# Altium footprint library con-molex.PCBLIB: 369 footprints (part 21 of 26)
Each footprint in its own frame and in the unit in brackets; x right, y up, seen from the top. Pads: shape width x height; smd on the part's side, far side on the other; paste and mask are expansions set on the pad; w line width, h text height; cw(c..) or ccw(c..) is an arc to the next point about the centre after c.
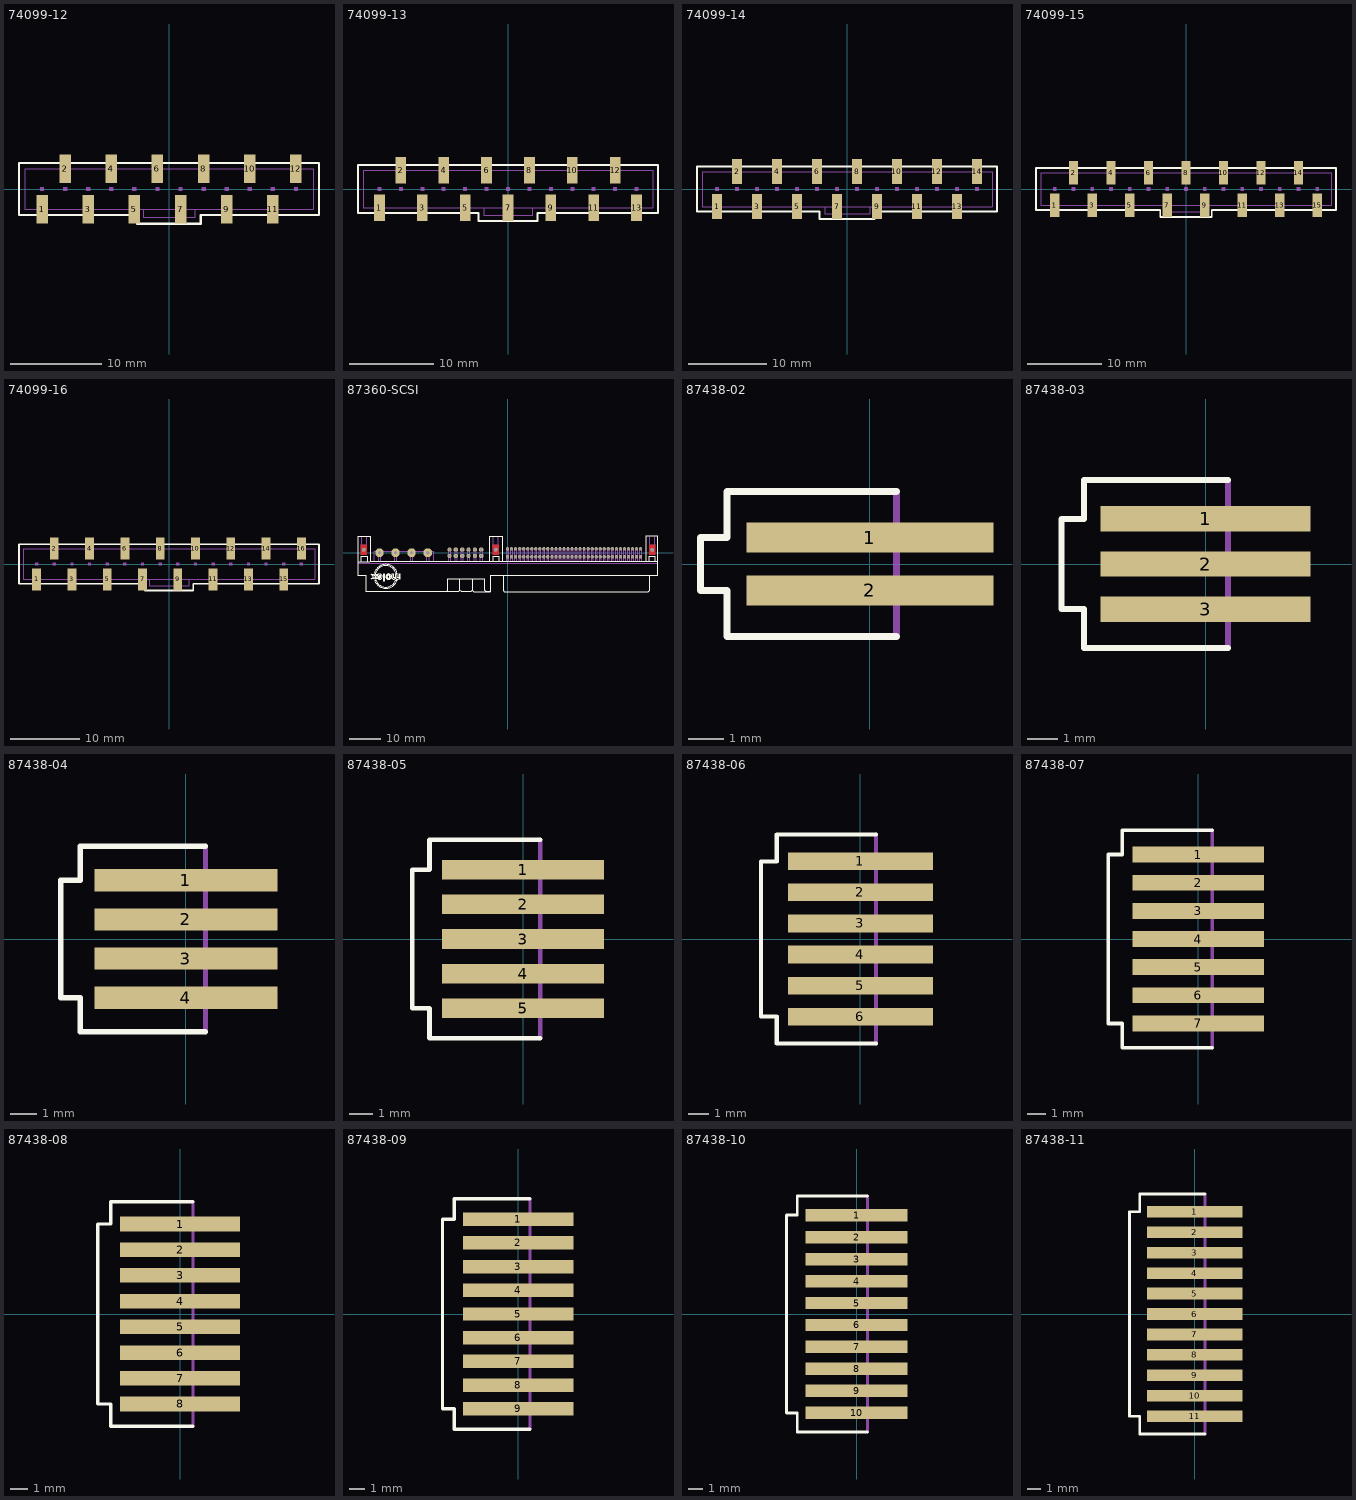
[diagram p20: the footprints below, top view; thin cyan lines are the x and y axes]

## 74099-12 [mil]
pads (12):
  rect 50x125 smd: 1(-550,-87.5) 2(-450,87.5) 3(-350,-87.5) 4(-250,87.5) 5(-150,-87.5) 6(-50,87.5) 7(50,-87.5) 8(150,87.5) 9(250,-87.5) 10(350,87.5) 11(450,-87.5) 12(550,87.5)
Top Overlay:
  lines w10: -650,-112.5 -650,112.5 650,112.5 650,-112.5 137.5,-112.5 137.5,-150 -137.5,-150 -137.5,-112.5 -650,-112.5
Mechanical 16:
  rectangle: -359.37,-9.37 -340.63,9.37
  rectangle: -459.37,-9.37 -440.63,9.37
  rectangle: -159.37,-9.37 -140.63,9.37
  rectangle: -259.37,-9.37 -240.63,9.37
  rectangle: -559.37,-9.37 -540.63,9.37
  rectangle: -59.37,-9.37 -40.63,9.37
  rectangle: 40.63,-9.37 59.37,9.37
  rectangle: 140.63,-9.37 159.37,9.37
  rectangle: 240.63,-9.37 259.37,9.37
  rectangle: 340.63,-9.37 359.37,9.37
  rectangle: 440.63,-9.37 459.37,9.37
  rectangle: 540.63,-9.37 559.37,9.37
  lines w2: -112.5,-87.5 -625,-87.5 -625,87.5 625,87.5 625,-87.5 112.5,-87.5 ; -112.5,-87.5 112.5,-87.5 ; -112.5,-87.5 -112.5,-125 112.5,-125 112.5,-87.5
  text "1" at -612.5,-75 h62

## 74099-13 [mil]
pads (13):
  rect 50x125 smd: 1(-600,-87.5) 2(-500,87.5) 3(-400,-87.5) 4(-300,87.5) 5(-200,-87.5) 6(-100,87.5) 7(0,-87.5) 8(100,87.5) 9(200,-87.5) 10(300,87.5) 11(400,-87.5) 12(500,87.5) 13(600,-87.5)
Top Overlay:
  lines w10: -700,-112.5 -700,112.5 700,112.5 700,-112.5 137.5,-112.5 137.5,-150 -137.5,-150 -137.5,-112.5 -700,-112.5
Mechanical 16:
  rectangle: -409.37,-9.37 -390.63,9.37
  rectangle: -509.37,-9.37 -490.63,9.37
  rectangle: -209.37,-9.37 -190.63,9.37
  rectangle: -309.37,-9.37 -290.63,9.37
  rectangle: -609.37,-9.37 -590.63,9.37
  rectangle: -109.37,-9.37 -90.63,9.37
  rectangle: -9.37,-9.37 9.37,9.37
  rectangle: 90.63,-9.37 109.37,9.37
  rectangle: 190.63,-9.37 209.37,9.37
  rectangle: 290.63,-9.37 309.37,9.37
  rectangle: 390.63,-9.37 409.37,9.37
  rectangle: 490.63,-9.37 509.37,9.37
  rectangle: 590.63,-9.37 609.37,9.37
  lines w2: -112.5,-87.5 -675,-87.5 -675,87.5 675,87.5 675,-87.5 112.5,-87.5 ; -112.5,-87.5 112.5,-87.5 ; -112.5,-87.5 -112.5,-125 112.5,-125 112.5,-87.5
  text "1" at -662.5,-75 h62

## 74099-14 [mil]
pads (14):
  rect 50x125 smd: 1(-650,-87.5) 2(-550,87.5) 3(-450,-87.5) 4(-350,87.5) 5(-250,-87.5) 6(-150,87.5) 7(-50,-87.5) 8(50,87.5) 9(150,-87.5) 10(250,87.5) 11(350,-87.5) 12(450,87.5) 13(550,-87.5) 14(650,87.5)
Top Overlay:
  lines w10: -750,-112.5 -750,112.5 750,112.5 750,-112.5 137.5,-112.5 137.5,-150 -137.5,-150 -137.5,-112.5 -750,-112.5
Mechanical 16:
  rectangle: -459.37,-9.37 -440.63,9.37
  rectangle: -559.37,-9.37 -540.63,9.37
  rectangle: -259.37,-9.37 -240.63,9.37
  rectangle: -359.37,-9.37 -340.63,9.37
  rectangle: -659.37,-9.37 -640.63,9.37
  rectangle: -159.37,-9.37 -140.63,9.37
  rectangle: -59.37,-9.37 -40.63,9.37
  rectangle: 40.63,-9.37 59.37,9.37
  rectangle: 140.63,-9.37 159.37,9.37
  rectangle: 240.63,-9.37 259.37,9.37
  rectangle: 340.63,-9.37 359.37,9.37
  rectangle: 440.63,-9.37 459.37,9.37
  rectangle: 540.63,-9.37 559.37,9.37
  rectangle: 640.63,-9.37 659.37,9.37
  lines w2: -112.5,-87.5 -725,-87.5 -725,87.5 725,87.5 725,-87.5 112.5,-87.5 ; -112.5,-87.5 112.5,-87.5 ; -112.5,-87.5 -112.5,-125 112.5,-125 112.5,-87.5
  text "1" at -712.5,-75 h62

## 74099-15 [mil]
pads (15):
  rect 50x125 smd: 1(-700,-87.5) 2(-600,87.5) 3(-500,-87.5) 4(-400,87.5) 5(-300,-87.5) 6(-200,87.5) 7(-100,-87.5) 8(0,87.5) 9(100,-87.5) 10(200,87.5) 11(300,-87.5) 12(400,87.5) 13(500,-87.5) 14(600,87.5) 15(700,-87.5)
Top Overlay:
  lines w10: -800,-112.5 -800,112.5 800,112.5 800,-112.5 137.5,-112.5 137.5,-150 -137.5,-150 -137.5,-112.5 -800,-112.5
Mechanical 16:
  rectangle: -509.37,-9.37 -490.63,9.37
  rectangle: -609.37,-9.37 -590.63,9.37
  rectangle: -309.37,-9.37 -290.63,9.37
  rectangle: -409.37,-9.37 -390.63,9.37
  rectangle: -709.37,-9.37 -690.63,9.37
  rectangle: -209.37,-9.37 -190.63,9.37
  rectangle: -109.37,-9.37 -90.63,9.37
  rectangle: -9.37,-9.37 9.37,9.37
  rectangle: 90.63,-9.37 109.37,9.37
  rectangle: 190.63,-9.37 209.37,9.37
  rectangle: 290.63,-9.37 309.37,9.37
  rectangle: 390.63,-9.37 409.37,9.37
  rectangle: 490.63,-9.37 509.37,9.37
  rectangle: 590.63,-9.37 609.37,9.37
  rectangle: 690.63,-9.37 709.37,9.37
  lines w2: -112.5,-87.5 -775,-87.5 -775,87.5 775,87.5 775,-87.5 112.5,-87.5 ; -112.5,-87.5 112.5,-87.5 ; -112.5,-87.5 -112.5,-125 112.5,-125 112.5,-87.5
  text "1" at -762.5,-75 h62

## 74099-16 [mil]
pads (16):
  rect 50x125 smd: 1(-750,-87.5) 2(-650,87.5) 3(-550,-87.5) 4(-450,87.5) 5(-350,-87.5) 6(-250,87.5) 7(-150,-87.5) 8(-50,87.5) 9(50,-87.5) 10(150,87.5) 11(250,-87.5) 12(350,87.5) 13(450,-87.5) 14(550,87.5) 15(650,-87.5) 16(750,87.5)
Top Overlay:
  lines w10: -850,-112.5 -850,112.5 850,112.5 850,-112.5 137.5,-112.5 137.5,-150 -137.5,-150 -137.5,-112.5 -850,-112.5
Mechanical 16:
  rectangle: -559.37,-9.37 -540.63,9.37
  rectangle: -659.37,-9.37 -640.63,9.37
  rectangle: -359.37,-9.37 -340.63,9.37
  rectangle: -459.37,-9.37 -440.63,9.37
  rectangle: -759.37,-9.37 -740.63,9.37
  rectangle: -259.37,-9.37 -240.63,9.37
  rectangle: -159.37,-9.37 -140.63,9.37
  rectangle: -59.37,-9.37 -40.63,9.37
  rectangle: 40.63,-9.37 59.37,9.37
  rectangle: 140.63,-9.37 159.37,9.37
  rectangle: 240.63,-9.37 259.37,9.37
  rectangle: 340.63,-9.37 359.37,9.37
  rectangle: 440.63,-9.37 459.37,9.37
  rectangle: 540.63,-9.37 559.37,9.37
  rectangle: 640.63,-9.37 659.37,9.37
  rectangle: 740.63,-9.37 759.37,9.37
  lines w2: -112.5,-87.5 -825,-87.5 -825,87.5 825,87.5 825,-87.5 112.5,-87.5 ; -112.5,-87.5 112.5,-87.5 ; -112.5,-87.5 -112.5,-125 112.5,-125 112.5,-87.5
  text "1" at -812.5,-75 h62

## 87360-SCSI [mil]
pads (87):
  round 44.88 hole 44.88: 1(-1783.27,36.22) 1(-145.08,36.22) 1(1795.08,36.22)
  oct 40x40 hole 27.56: 1(0,50) 2(50,50) 3(100,50) 4(150,50) 5(200,50) 6(250,50) 7(300,50) 8(350,50) 9(400,50) 10(450,50) 11(500,50) 12(550,50) 13(600,50) 14(650,50) 15(700,50) 16(750,50) 17(800,50) 18(850,50) 19(900,50) 20(950,50) 21(1000,50) 22(1050,50) 23(1100,50) 24(1150,50) 25(1200,50) 26(1250,50) 27(1300,50) 28(1350,50) 29(1400,50) 30(1450,50) 31(1500,50) 32(1550,50) 33(1600,50) 34(1650,50) 35(0,-50) 36(50,-50) 37(100,-50) 38(150,-50) 39(200,-50) 40(250,-50) 41(300,-50) 42(350,-50) 43(400,-50) 44(450,-50) 45(500,-50) 46(550,-50) 47(600,-50) 48(650,-50) 49(700,-50) 50(750,-50) 51(800,-50) 52(850,-50) 53(900,-50) 54(950,-50) 55(1000,-50) 56(1050,-50) 57(1100,-50) 58(1150,-50) 59(1200,-50) 60(1250,-50) 61(1300,-50) 62(1350,-50) 63(1400,-50) 64(1450,-50) 65(1500,-50) 66(1550,-50) 67(1600,-50) 68(1650,-50)
  oct 53.15x53.15 hole 35.43: J1(-719.69,39.37) J2(-719.69,-39.37) J3(-640.94,39.37) J4(-640.94,-39.37) J5(-562.2,39.37) J6(-562.2,-39.37) J7(-483.46,39.37) J8(-483.46,-39.37) J9(-404.72,39.37) J10(-404.72,-39.37) J11(-325.98,39.37) J12(-325.98,-39.37)
  oct 100x100 hole 39.37: P1(-1589.76,0) P2(-1389.76,0) P3(-1189.76,0) P4(-989.76,0)
Top Layer:
  rectangle: -1823.23,-26.57 -1743.5,99.41
  rectangle: -184.45,-26.57 -105.71,99.41
  rectangle: 1755.51,-26.57 1834.25,99.41
Bottom Layer:
  rectangle: -1823.23,-26.57 -1743.5,99.41
  rectangle: -184.45,-26.57 -105.71,99.41
  rectangle: 1755.51,-26.57 1834.25,99.41
Top Overlay:
  circle w8: c-1476.94,-297.65 r33.91
  circle w8: c-1476.94,-297.65 r18.84
  lines w8: -1854.33,-130.59 -1854.33,-287.4 ; -1850.39,-110.24 -1708.66,-110.24 ; -1814.96,-106.3 -1814.96,-43.31 -1740.16,-43.31 -1740.16,-106.3 ; -1638.98,-256.22 -1654.02,-256.22 cw(c-1510.32,-293.9) -1367.67,-252.45 ; -1638.96,-259.97 cw(c-1510.86,-293.88) -1382.75,-259.97 ; -1616.34,-293.9 -1571.14,-293.9 -1571.14,-286.34 -1574.92,-282.6 -1593.74,-282.6 -1601.3,-290.12 ; -1397.83,-312.72 -1409.13,-312.72 -1412.91,-308.94 -1412.91,-267.52 -1435.51,-267.52 -1435.51,-312.72 -1420.43,-327.8 -1405.35,-327.8 -1394.06,-316.5 ; -1386.54,-342.87 -1371.46,-342.87 cw(c-1510.23,-293.88) -1650.28,-339.09 -1635.2,-339.09 ccw(c-1510.87,-293.88) -1386.53,-339.09 ; -1382.76,-256.22 -1367.68,-256.22 ; -1356.38,-312.72 -1367.68,-312.72 -1371.46,-308.94 -1371.46,-267.52 -1394.06,-267.52 -1394.06,-312.72 -1378.98,-327.8 -1360.16,-327.8 -1352.6,-320.28 ; -609.13,-484.25 -610.24,-484.25 ; -588.62,-326.77 -439.84,-326.77 ; -456.69,-484.25 -437.01,-464.57 ; -455,-484.25 -570.87,-484.25 -590.55,-464.57 ; -417.32,-484.25 -437.01,-464.57 ; -416.85,-484.25 -212.6,-484.25 ; -181.1,-110.24 -220.47,-110.24 ; -102.36,-110.24 -66.93,-110.24 ; 1718.98,-110.24 1863.46,-110.24 ; 1866.14,-130.59 1866.14,-287.4 ; 1866.14,196.85 1866.14,204.72 ; -1854.33,-287.4 -1755.91,-287.4 ; -1854.33,-287.4 -1755.91,-287.4 ; -1854.33,-287.4 -1854.33,204.72 -1700.79,204.72 -1700.79,-110.24 -220.47,-110.24 ; -1755.91,-484.25 -1755.91,-287.4 ; -1755.91,-484.25 -759.84,-484.25 -748.03,-472.44 -748.03,-326.77 -590.55,-326.77 ; -1755.91,-484.25 -1755.91,-287.4 ; -1755.91,-484.25 -610.24,-484.25 ; -610.24,-484.25 -590.55,-464.57 ; -590.55,-464.57 -590.55,-326.77 ; -590.55,-464.57 -590.55,-326.77 ; -437.01,-464.57 -437.01,-326.77 ; -437.01,-464.57 -437.01,-326.77 ; -437.01,-326.77 -283.46,-326.77 -283.46,-464.57 -263.78,-484.25 -212.6,-484.25 ; -220.47,-110.24 -220.47,204.72 -66.93,204.72 -66.93,-110.24 ; -212.6,-484.25 -212.6,-287.4 ; -212.6,-484.25 -212.6,-287.4 ; -212.6,-287.4 -55.12,-287.4 ; -212.6,-287.4 -55.12,-287.4 ; -66.93,-110.24 1716.54,-110.24 1716.54,204.72 1866.14,204.72 ; -55.12,-468.5 -55.12,-287.4 ; -55.12,-468.5 -39.37,-484.25 ; -55.12,-468.5 -55.12,-287.4 ; -55.12,-468.5 -39.37,-484.25 ; -55.12,-287.4 1755.91,-287.4 ; -55.12,-287.4 1755.91,-287.4 ; -39.37,-484.25 1744.09,-484.25 ; -39.37,-484.25 1744.09,-484.25 ; 1744.09,-484.25 1755.91,-472.44 ; 1744.09,-484.25 1755.91,-472.44 ; 1755.91,-472.44 1755.91,-287.4 ; 1755.91,-472.44 1755.91,-287.4 ; 1755.91,-287.4 1866.14,-287.4 ; 1755.91,-287.4 1866.14,-287.4 ; 1866.14,-287.4 1866.14,204.72 ; -1691.69,-267.52 -1669.09,-267.52 -1654.02,-282.6 -1638.98,-267.52 -1616.34,-267.52 -1642.72,-293.9 -1642.72,-301.42 -1620.12,-324.02 -1642.72,-324.02 -1654.02,-312.72 -1665.31,-324.02 -1687.95,-324.02 -1665.31,-301.42 -1665.31,-293.9 -1691.69,-267.52 ; -1620.12,-301.42 -1620.12,-286.34 -1601.3,-267.52 -1571.14,-267.52 -1556.06,-282.6 -1556.06,-305.2 -1559.84,-316.5 -1574.92,-327.8 -1597.52,-327.8 -1616.34,-312.72 -1620.12,-301.42 ; -1601.3,-305.2 -1571.14,-305.2 -1582.44,-316.5 -1589.96,-316.5 -1601.3,-305.2 ; -1544.76,-350.39 -1544.76,-267.52 -1525.94,-267.52 -1525.94,-350.39 -1544.76,-350.39 ; -1352.6,-316.5 -1352.6,-267.52 -1330,-267.52 -1330,-324.02 -1345.08,-324.02 -1352.6,-316.5 ; -177.17,-110.24 -106.3,-110.24 -106.3,-43.31 -177.17,-43.31 -177.17,-110.24 ; 1755.91,-110.24 1826.77,-110.24 1826.77,-43.31 1755.91,-43.31 1755.91,-110.24
Mechanical 1:
  lines w0: -1855.28,-128.74 1866.3,-128.74
Mechanical 16:
  drawing of 156 lines, arcs and shapes, not listed

## 87438-02 [mm]
pads (2):
  rect 7x0.85 smd: 1(0,0.75) 2(0,-0.75)
Top Overlay:
  lines w0.203: 0.75,-2.05 -4.05,-2.05 -4.05,-0.75 -4.8,-0.75 -4.8,0.75 -4.05,0.75 -4.05,2.05 0.75,2.05
Mechanical 16:
  rectangle: 0.8,0.525 2.85,0.975
  rectangle: 0.8,-0.975 2.85,-0.525
  lines w0.203: 0.75,-2.05 0.75,2.05

## 87438-03 [mm]
pads (3):
  rect 7x0.85 smd: 1(0,1.5) 2(0,0) 3(0,-1.5)
Top Overlay:
  lines w0.203: 0.75,-2.8 -4.05,-2.8 -4.05,-1.5 -4.8,-1.5 -4.8,1.5 -4.05,1.5 -4.05,2.8 0.75,2.8
Mechanical 16:
  rectangle: 0.8,1.275 2.85,1.725
  rectangle: 0.8,-0.225 2.85,0.225
  rectangle: 0.8,-1.725 2.85,-1.275
  lines w0.203: 0.75,-2.8 0.75,2.8

## 87438-04 [mm]
pads (4):
  rect 7x0.85 smd: 1(0,2.25) 2(0,0.75) 3(0,-0.75) 4(0,-2.25)
Top Overlay:
  lines w0.203: 0.75,-3.55 -4.05,-3.55 -4.05,-2.25 -4.8,-2.25 -4.8,2.25 -4.05,2.25 -4.05,3.55 0.75,3.55
Mechanical 16:
  rectangle: 0.8,2.025 2.85,2.475
  rectangle: 0.8,0.525 2.85,0.975
  rectangle: 0.8,-0.975 2.85,-0.525
  rectangle: 0.8,-2.475 2.85,-2.025
  lines w0.203: 0.75,-3.55 0.75,3.55

## 87438-05 [mm]
pads (5):
  rect 7x0.85 smd: 1(0,3) 2(0,1.5) 3(0,0) 4(0,-1.5) 5(0,-3)
Top Overlay:
  lines w0.203: 0.75,-4.3 -4.05,-4.3 -4.05,-3 -4.8,-3 -4.8,3 -4.05,3 -4.05,4.3 0.75,4.3
Mechanical 16:
  rectangle: 0.8,2.775 2.85,3.225
  rectangle: 0.8,1.275 2.85,1.725
  rectangle: 0.8,-0.225 2.85,0.225
  rectangle: 0.8,-1.725 2.85,-1.275
  rectangle: 0.8,-3.225 2.85,-2.775
  lines w0.203: 0.75,-4.3 0.75,4.3

## 87438-06 [mm]
pads (6):
  rect 7x0.85 smd: 1(0,3.75) 2(0,2.25) 3(0,0.75) 4(0,-0.75) 5(0,-2.25) 6(0,-3.75)
Top Overlay:
  lines w0.203: 0.75,-5.05 -4.05,-5.05 -4.05,-3.75 -4.8,-3.75 -4.8,3.75 -4.05,3.75 -4.05,5.05 0.75,5.05
Mechanical 16:
  rectangle: 0.8,3.525 2.85,3.975
  rectangle: 0.8,2.025 2.85,2.475
  rectangle: 0.8,0.525 2.85,0.975
  rectangle: 0.8,-0.975 2.85,-0.525
  rectangle: 0.8,-2.475 2.85,-2.025
  rectangle: 0.8,-3.975 2.85,-3.525
  lines w0.203: 0.75,-5.05 0.75,5.05

## 87438-07 [mm]
pads (7):
  rect 7x0.85 smd: 1(0,4.5) 2(0,3) 3(0,1.5) 4(0,0) 5(0,-1.5) 6(0,-3) 7(0,-4.5)
Top Overlay:
  lines w0.203: 0.75,-5.8 -4.05,-5.8 -4.05,-4.5 -4.8,-4.5 -4.8,4.5 -4.05,4.5 -4.05,5.8 0.75,5.8
Mechanical 16:
  rectangle: 0.8,4.275 2.85,4.725
  rectangle: 0.8,2.775 2.85,3.225
  rectangle: 0.8,1.275 2.85,1.725
  rectangle: 0.8,-0.225 2.85,0.225
  rectangle: 0.8,-1.725 2.85,-1.275
  rectangle: 0.8,-3.225 2.85,-2.775
  rectangle: 0.8,-4.725 2.85,-4.275
  lines w0.203: 0.75,-5.8 0.75,5.8

## 87438-08 [mm]
pads (8):
  rect 7x0.85 smd: 1(0,5.25) 2(0,3.75) 3(0,2.25) 4(0,0.75) 5(0,-0.75) 6(0,-2.25) 7(0,-3.75) 8(0,-5.25)
Top Overlay:
  lines w0.203: 0.75,-6.55 -4.05,-6.55 -4.05,-5.25 -4.8,-5.25 -4.8,5.25 -4.05,5.25 -4.05,6.55 0.75,6.55
Mechanical 16:
  rectangle: 0.8,5.025 2.85,5.475
  rectangle: 0.8,3.525 2.85,3.975
  rectangle: 0.8,2.025 2.85,2.475
  rectangle: 0.8,0.525 2.85,0.975
  rectangle: 0.8,-0.975 2.85,-0.525
  rectangle: 0.8,-2.475 2.85,-2.025
  rectangle: 0.8,-3.975 2.85,-3.525
  rectangle: 0.8,-5.475 2.85,-5.025
  lines w0.203: 0.75,-6.55 0.75,6.55

## 87438-09 [mm]
pads (9):
  rect 7x0.85 smd: 1(0,6) 2(0,4.5) 3(0,3) 4(0,1.5) 5(0,0) 6(0,-1.5) 7(0,-3) 8(0,-4.5) 9(0,-6)
Top Overlay:
  lines w0.203: 0.75,-7.3 -4.05,-7.3 -4.05,-6 -4.8,-6 -4.8,6 -4.05,6 -4.05,7.3 0.75,7.3
Mechanical 16:
  rectangle: 0.8,5.775 2.85,6.225
  rectangle: 0.8,4.275 2.85,4.725
  rectangle: 0.8,2.775 2.85,3.225
  rectangle: 0.8,1.275 2.85,1.725
  rectangle: 0.8,-0.225 2.85,0.225
  rectangle: 0.8,-1.725 2.85,-1.275
  rectangle: 0.8,-3.225 2.85,-2.775
  rectangle: 0.8,-4.725 2.85,-4.275
  rectangle: 0.8,-6.225 2.85,-5.775
  lines w0.203: 0.75,-7.3 0.75,7.3

## 87438-10 [mm]
pads (10):
  rect 7x0.85 smd: 1(0,6.75) 2(0,5.25) 3(0,3.75) 4(0,2.25) 5(0,0.75) 6(0,-0.75) 7(0,-2.25) 8(0,-3.75) 9(0,-5.25) 10(0,-6.75)
Top Overlay:
  lines w0.203: 0.75,-8.05 -4.05,-8.05 -4.05,-6.75 -4.8,-6.75 -4.8,6.75 -4.05,6.75 -4.05,8.05 0.75,8.05
Mechanical 16:
  rectangle: 0.8,6.525 2.85,6.975
  rectangle: 0.8,5.025 2.85,5.475
  rectangle: 0.8,3.525 2.85,3.975
  rectangle: 0.8,2.025 2.85,2.475
  rectangle: 0.8,0.525 2.85,0.975
  rectangle: 0.8,-0.975 2.85,-0.525
  rectangle: 0.8,-2.475 2.85,-2.025
  rectangle: 0.8,-3.975 2.85,-3.525
  rectangle: 0.8,-5.475 2.85,-5.025
  rectangle: 0.8,-6.975 2.85,-6.525
  lines w0.203: 0.75,-8.05 0.75,8.05

## 87438-11 [mm]
pads (11):
  rect 7x0.85 smd: 1(0,7.5) 2(0,6) 3(0,4.5) 4(0,3) 5(0,1.5) 6(0,0) 7(0,-1.5) 8(0,-3) 9(0,-4.5) 10(0,-6) 11(0,-7.5)
Top Overlay:
  lines w0.203: 0.75,-8.8 -4.05,-8.8 -4.05,-7.5 -4.8,-7.5 -4.8,7.5 -4.05,7.5 -4.05,8.8 0.75,8.8
Mechanical 16:
  rectangle: 0.8,7.275 2.85,7.725
  rectangle: 0.8,5.775 2.85,6.225
  rectangle: 0.8,4.275 2.85,4.725
  rectangle: 0.8,2.775 2.85,3.225
  rectangle: 0.8,1.275 2.85,1.725
  rectangle: 0.8,-0.225 2.85,0.225
  rectangle: 0.8,-1.725 2.85,-1.275
  rectangle: 0.8,-3.225 2.85,-2.775
  rectangle: 0.8,-4.725 2.85,-4.275
  rectangle: 0.8,-6.225 2.85,-5.775
  rectangle: 0.8,-7.725 2.85,-7.275
  lines w0.203: 0.75,-8.8 0.75,8.8